# Altium integrated library Blues Wireless Library.IntLib: 99 symbols (part 1 of 2)
Pins are listed as number, name and electrical type; pins without a type are passive.

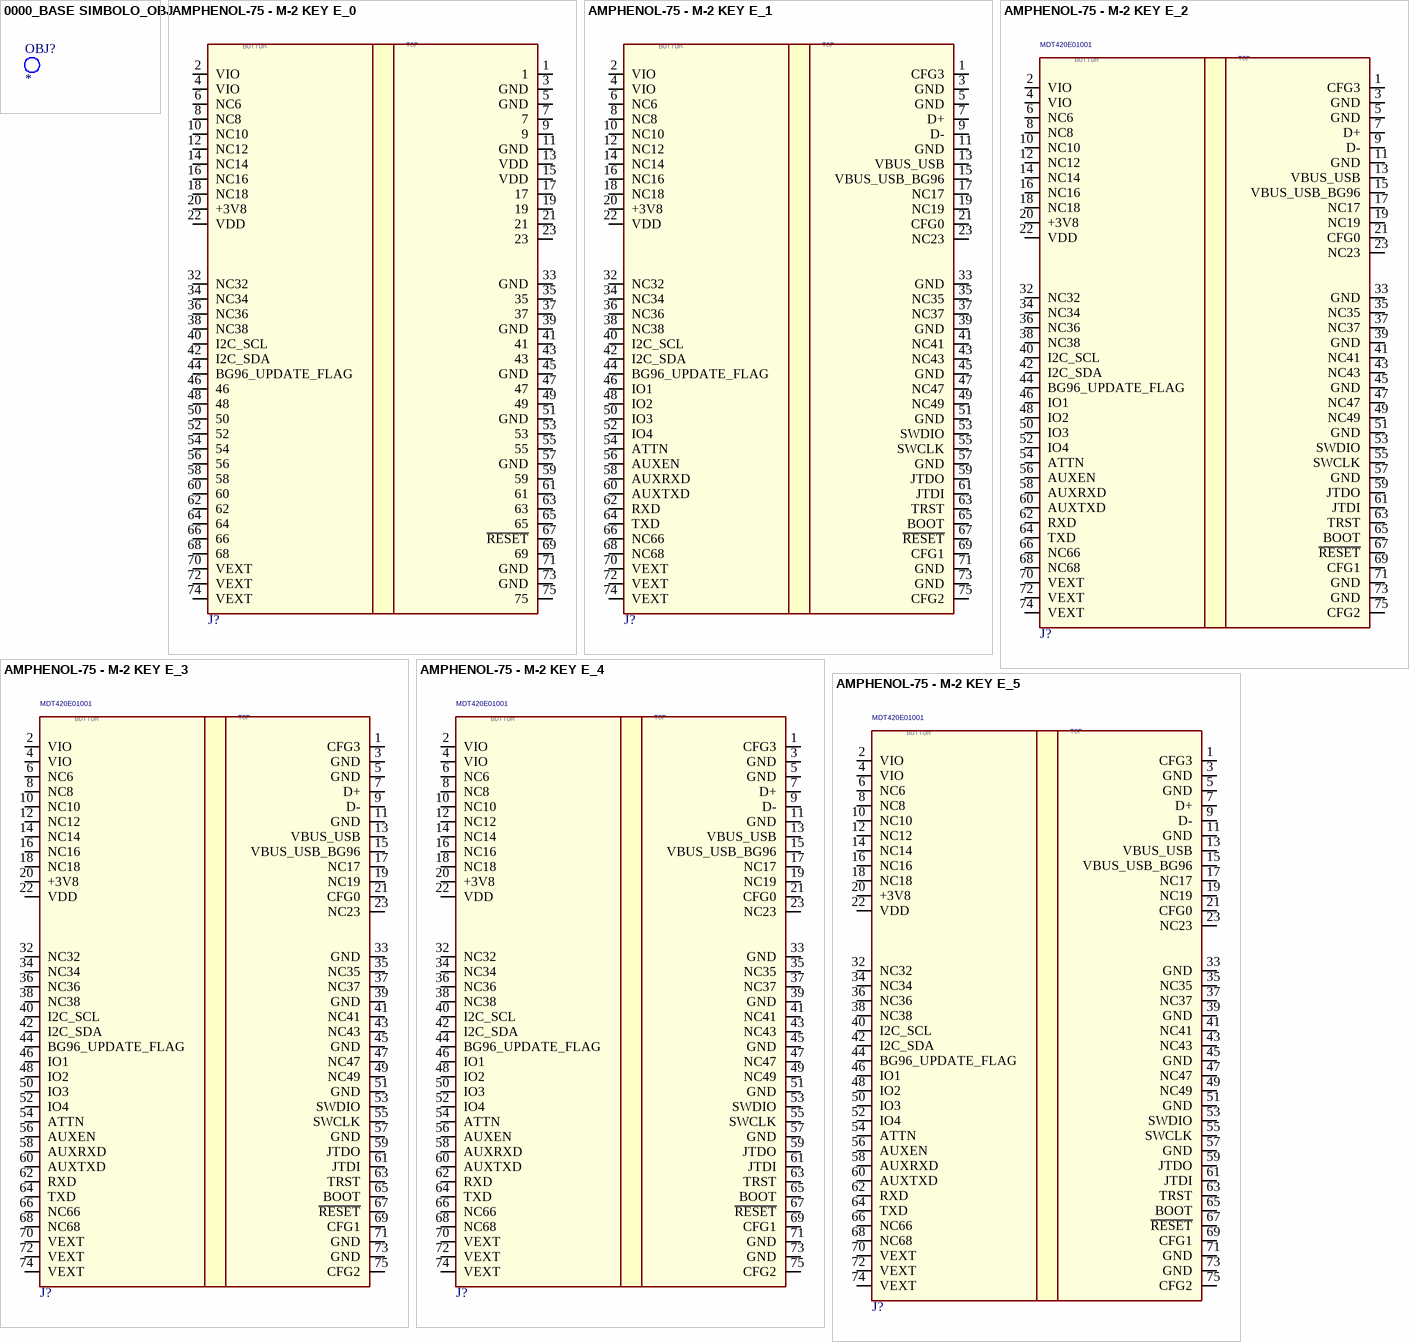
[diagram p0: symbols 0000_BASE SIMBOLO_OBJ to AMPHENOL-75 - M-2 KEY E_5]

## 0000_BASE SIMBOLO_OBJ
designator OBJ?

## AMPHENOL-75 - M-2 KEY E_0
designator J?, comment MDT420E01001  (value not drawn)
CONN. 75P P=0.5 MDT420E01001 AMPHENOL SMT; Famiglia: CONNETTORE; Pkg Type: SMD; Temp Range: -40°..+80°; Caratteristiche: 75P; Distributor: D-MDT420E01001CT-ND; Price Distributor Cad: 1,21
footprint M2-E-AMPHENOL-75
pins: 1, 2 VIO (power), 3 GND (power), 4 VIO (power), 5 GND (power), 6 NC6, 7, 8 NC8, 9, 10 NC10, 11 GND (power), 12 NC12, 13 VDD (power), 14 NC14, 15 VDD (power), 16 NC16, 17, 18 NC18, 19, 20 +3V8 (power), 21, 22 VDD (power), 23, 32 NC32, 33 GND (power), 34 NC34, 35, 36 NC36, 37, 38 NC38, 39 GND (power), 40 I2C_SCL, 41, 42 I2C_SDA, 43, 44 BG96_UPDATE_FLAG, 45 GND (power), 46, 47, 48, 49, 50, 51 GND (power), 52, 53, 54, 55, 56, 57 GND (power), 58, 59, 60, 61, 62, 63, 64, 65, 66, 67 ~{RESET}, 68, 69, 70 VEXT (power), 71 GND (power), 72 VEXT (power), 73 GND (power), 74 VEXT (power), 75
text: BOTTOM; TOP

## AMPHENOL-75 - M-2 KEY E_1
designator J?, comment MDT420E01001  (value not drawn)
CONN. 75P P=0.5 MDT420E01001 AMPHENOL SMT; Famiglia: CONNETTORE; Pkg Type: SMD; Temp Range: -40°..+80°; Caratteristiche: 75P; Distributor: D-MDT420E01001CT-ND; Price Distributor Cad: 1,21
footprint M2-E-AMPHENOL-75
pins: 1 CFG3, 2 VIO (power), 3 GND (power), 4 VIO (power), 5 GND (power), 6 NC6, 7 D+, 8 NC8, 9 D-, 10 NC10, 11 GND (power), 12 NC12, 13 VBUS_USB (power), 14 NC14, 15 VBUS_USB_BG96 (power), 16 NC16, 17 NC17, 18 NC18, 19 NC19, 20 +3V8 (power), 21 CFG0, 22 VDD (power), 23 NC23, 32 NC32, 33 GND (power), 34 NC34, 35 NC35, 36 NC36, 37 NC37, 38 NC38, 39 GND (power), 40 I2C_SCL, 41 NC41, 42 I2C_SDA, 43 NC43, 44 BG96_UPDATE_FLAG, 45 GND (power), 46 IO1, 47 NC47, 48 IO2, 49 NC49, 50 IO3, 51 GND (power), 52 IO4, 53 SWDIO, 54 ATTN, 55 SWCLK, 56 AUXEN, 57 GND (power), 58 AUXRXD, 59 JTDO, 60 AUXTXD, 61 JTDI, 62 RXD, 63 TRST, 64 TXD, 65 BOOT, 66 NC66, 67 ~{RESET}, 68 NC68, 69 CFG1, 70 VEXT (power), 71 GND (power), 72 VEXT (power), 73 GND (power), 74 VEXT (power), 75 CFG2
text: BOTTOM; TOP

## AMPHENOL-75 - M-2 KEY E_2
designator J?, comment MDT420E01001
CONN. 75P P=0.5 MDT420E01001 AMPHENOL SMT; Famiglia: CONNETTORE; Pkg Type: SMD; Temp Range: -40°..+80°; Caratteristiche: 75P; Distributor: D-MDT420E01001CT-ND; Price Distributor Cad: 1,21
footprint M2-E-AMPHENOL-75
pins: 1 CFG3, 2 VIO (power), 3 GND (power), 4 VIO (power), 5 GND (power), 6 NC6, 7 D+, 8 NC8, 9 D-, 10 NC10, 11 GND (power), 12 NC12, 13 VBUS_USB (power), 14 NC14, 15 VBUS_USB_BG96 (power), 16 NC16, 17 NC17, 18 NC18, 19 NC19, 20 +3V8 (power), 21 CFG0, 22 VDD (power), 23 NC23, 32 NC32, 33 GND (power), 34 NC34, 35 NC35, 36 NC36, 37 NC37, 38 NC38, 39 GND (power), 40 I2C_SCL, 41 NC41, 42 I2C_SDA, 43 NC43, 44 BG96_UPDATE_FLAG, 45 GND (power), 46 IO1, 47 NC47, 48 IO2, 49 NC49, 50 IO3, 51 GND (power), 52 IO4, 53 SWDIO, 54 ATTN, 55 SWCLK, 56 AUXEN, 57 GND (power), 58 AUXRXD, 59 JTDO, 60 AUXTXD, 61 JTDI, 62 RXD, 63 TRST, 64 TXD, 65 BOOT, 66 NC66, 67 ~{RESET}, 68 NC68, 69 CFG1, 70 VEXT (power), 71 GND (power), 72 VEXT (power), 73 GND (power), 74 VEXT (power), 75 CFG2
text: BOTTOM; TOP

## AMPHENOL-75 - M-2 KEY E_3
designator J?, comment MDT420E01001
CONN. 75P P=0.5 MDT420E01001 AMPHENOL SMT; Temp Range: -40°..+80°; Pkg Type: SMD; Famiglia: CONNETTORE; Price Distributor Cad: 1,21; Distributor: D-MDT420E01001CT-ND; Caratteristiche: 75P
footprint J-75-0050-MOS-M2
pins: 1 CFG3, 2 VIO (power), 3 GND (power), 4 VIO (power), 5 GND (power), 6 NC6, 7 D+, 8 NC8, 9 D-, 10 NC10, 11 GND (power), 12 NC12, 13 VBUS_USB (power), 14 NC14, 15 VBUS_USB_BG96 (power), 16 NC16, 17 NC17, 18 NC18, 19 NC19, 20 +3V8 (power), 21 CFG0, 22 VDD (power), 23 NC23, 32 NC32, 33 GND (power), 34 NC34, 35 NC35, 36 NC36, 37 NC37, 38 NC38, 39 GND (power), 40 I2C_SCL, 41 NC41, 42 I2C_SDA, 43 NC43, 44 BG96_UPDATE_FLAG, 45 GND (power), 46 IO1, 47 NC47, 48 IO2, 49 NC49, 50 IO3, 51 GND (power), 52 IO4, 53 SWDIO, 54 ATTN, 55 SWCLK, 56 AUXEN, 57 GND (power), 58 AUXRXD, 59 JTDO, 60 AUXTXD, 61 JTDI, 62 RXD, 63 TRST, 64 TXD, 65 BOOT, 66 NC66, 67 ~{RESET}, 68 NC68, 69 CFG1, 70 VEXT (power), 71 GND (power), 72 VEXT (power), 73 GND (power), 74 VEXT (power), 75 CFG2
text: BOTTOM; TOP

## AMPHENOL-75 - M-2 KEY E_4
designator J?, comment MDT420E01001
CONN. 75P P=0.5 MDT420E01001 AMPHENOL SMT; Temp Range: -40°..+80°; Pkg Type: SMD; Famiglia: CONNETTORE; Price Distributor Cad: 1,21; Distributor: D-MDT420E01001CT-ND; Caratteristiche: 75P
footprint J-75-0050-MOS-M2
pins: 1 CFG3, 2 VIO (power), 3 GND (power), 4 VIO (power), 5 GND (power), 6 NC6, 7 D+, 8 NC8, 9 D-, 10 NC10, 11 GND (power), 12 NC12, 13 VBUS_USB (power), 14 NC14, 15 VBUS_USB_BG96 (power), 16 NC16, 17 NC17, 18 NC18, 19 NC19, 20 +3V8 (power), 21 CFG0, 22 VDD (power), 23 NC23, 32 NC32, 33 GND (power), 34 NC34, 35 NC35, 36 NC36, 37 NC37, 38 NC38, 39 GND (power), 40 I2C_SCL, 41 NC41, 42 I2C_SDA, 43 NC43, 44 BG96_UPDATE_FLAG, 45 GND (power), 46 IO1, 47 NC47, 48 IO2, 49 NC49, 50 IO3, 51 GND (power), 52 IO4, 53 SWDIO, 54 ATTN, 55 SWCLK, 56 AUXEN, 57 GND (power), 58 AUXRXD, 59 JTDO, 60 AUXTXD, 61 JTDI, 62 RXD, 63 TRST, 64 TXD, 65 BOOT, 66 NC66, 67 ~{RESET}, 68 NC68, 69 CFG1, 70 VEXT (power), 71 GND (power), 72 VEXT (power), 73 GND (power), 74 VEXT (power), 75 CFG2
text: BOTTOM; TOP

## AMPHENOL-75 - M-2 KEY E_5
designator J?, comment MDT420E01001
CONN. 75P P=0.5 MDT420E01001 AMPHENOL SMT; Famiglia: CONNETTORE; Pkg Type: SMD; Temp Range: -40°..+80°; Caratteristiche: 75P; Distributor: D-MDT420E01001CT-ND; Price Distributor Cad: 1,21
footprint J-75-0050-MOS-M2
pins: 1 CFG3, 2 VIO (power), 3 GND (power), 4 VIO (power), 5 GND (power), 6 NC6, 7 D+, 8 NC8, 9 D-, 10 NC10, 11 GND (power), 12 NC12, 13 VBUS_USB (power), 14 NC14, 15 VBUS_USB_BG96 (power), 16 NC16, 17 NC17, 18 NC18, 19 NC19, 20 +3V8 (power), 21 CFG0, 22 VDD (power), 23 NC23, 32 NC32, 33 GND (power), 34 NC34, 35 NC35, 36 NC36, 37 NC37, 38 NC38, 39 GND (power), 40 I2C_SCL, 41 NC41, 42 I2C_SDA, 43 NC43, 44 BG96_UPDATE_FLAG, 45 GND (power), 46 IO1, 47 NC47, 48 IO2, 49 NC49, 50 IO3, 51 GND (power), 52 IO4, 53 SWDIO, 54 ATTN, 55 SWCLK, 56 AUXEN, 57 GND (power), 58 AUXRXD, 59 JTDO, 60 AUXTXD, 61 JTDI, 62 RXD, 63 TRST, 64 TXD, 65 BOOT, 66 NC66, 67 ~{RESET}, 68 NC68, 69 CFG1, 70 VEXT (power), 71 GND (power), 72 VEXT (power), 73 GND (power), 74 VEXT (power), 75 CFG2
text: BOTTOM; TOP

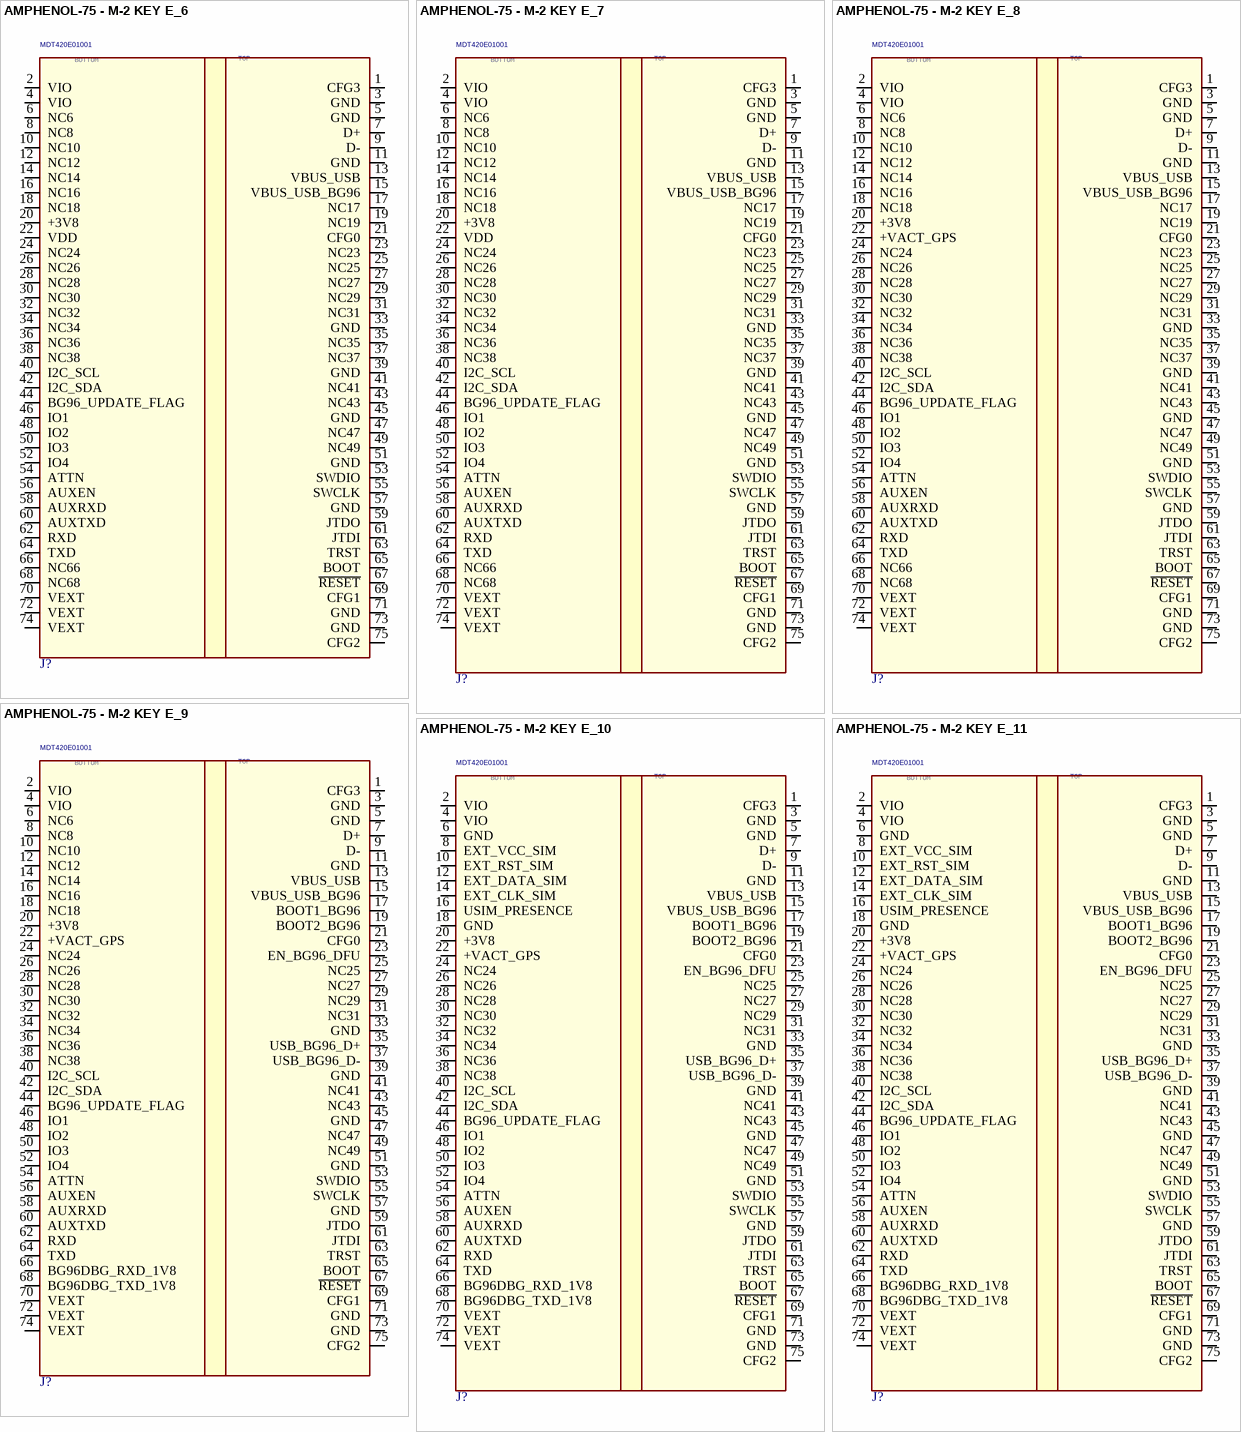
[diagram p1: symbols AMPHENOL-75 - M-2 KEY E_6 to AMPHENOL-75 - M-2 KEY E_11]

## AMPHENOL-75 - M-2 KEY E_6
designator J?, comment MDT420E01001
CONN. 75P P=0.5 MDT420E01001 AMPHENOL SMT; Temp Range: -40°..+80°; Pkg Type: SMD; Famiglia: CONNETTORE; Price Distributor Cad: 1,21; Distributor: D-MDT420E01001CT-ND; Caratteristiche: 75P
footprint J-75-0050-MOS-M2
pins: 1 CFG3, 2 VIO (power), 3 GND (power), 4 VIO (power), 5 GND (power), 6 NC6, 7 D+, 8 NC8, 9 D-, 10 NC10, 11 GND (power), 12 NC12, 13 VBUS_USB (power), 14 NC14, 15 VBUS_USB_BG96 (power), 16 NC16, 17 NC17, 18 NC18, 19 NC19, 20 +3V8 (power), 21 CFG0, 22 VDD (power), 23 NC23, 24 NC24, 25 NC25, 26 NC26, 27 NC27, 28 NC28, 29 NC29, 30 NC30, 31 NC31, 32 NC32, 33 GND (power), 34 NC34, 35 NC35, 36 NC36, 37 NC37, 38 NC38, 39 GND (power), 40 I2C_SCL, 41 NC41, 42 I2C_SDA, 43 NC43, 44 BG96_UPDATE_FLAG, 45 GND (power), 46 IO1, 47 NC47, 48 IO2, 49 NC49, 50 IO3, 51 GND (power), 52 IO4, 53 SWDIO, 54 ATTN, 55 SWCLK, 56 AUXEN, 57 GND (power), 58 AUXRXD, 59 JTDO, 60 AUXTXD, 61 JTDI, 62 RXD, 63 TRST, 64 TXD, 65 BOOT, 66 NC66, 67 ~{RESET}, 68 NC68, 69 CFG1, 70 VEXT (power), 71 GND (power), 72 VEXT (power), 73 GND (power), 74 VEXT (power), 75 CFG2
text: BOTTOM; TOP

## AMPHENOL-75 - M-2 KEY E_7
designator J?, comment MDT420E01001
CONN. 75P P=0.5 MDT420E01001 AMPHENOL SMT; Temp Range: -40°..+80°; Pkg Type: SMD; Famiglia: CONNETTORE; Price Distributor Cad: 1,21; Distributor: D-MDT420E01001CT-ND; Caratteristiche: 75P
footprint J-75-0050-MOS-M2
pins: 1 CFG3, 2 VIO (power), 3 GND (power), 4 VIO (power), 5 GND (power), 6 NC6, 7 D+, 8 NC8, 9 D-, 10 NC10, 11 GND (power), 12 NC12, 13 VBUS_USB (power), 14 NC14, 15 VBUS_USB_BG96 (power), 16 NC16, 17 NC17, 18 NC18, 19 NC19, 20 +3V8 (power), 21 CFG0, 22 VDD (power), 23 NC23, 24 NC24, 25 NC25, 26 NC26, 27 NC27, 28 NC28, 29 NC29, 30 NC30, 31 NC31, 32 NC32, 33 GND (power), 34 NC34, 35 NC35, 36 NC36, 37 NC37, 38 NC38, 39 GND (power), 40 I2C_SCL, 41 NC41, 42 I2C_SDA, 43 NC43, 44 BG96_UPDATE_FLAG, 45 GND (power), 46 IO1, 47 NC47, 48 IO2, 49 NC49, 50 IO3, 51 GND (power), 52 IO4, 53 SWDIO, 54 ATTN, 55 SWCLK, 56 AUXEN, 57 GND (power), 58 AUXRXD, 59 JTDO, 60 AUXTXD, 61 JTDI, 62 RXD, 63 TRST, 64 TXD, 65 BOOT, 66 NC66, 67 ~{RESET}, 68 NC68, 69 CFG1, 70 VEXT (power), 71 GND (power), 72 VEXT (power), 73 GND (power), 74 VEXT (power), 75 CFG2
text: BOTTOM; TOP

## AMPHENOL-75 - M-2 KEY E_8
designator J?, comment MDT420E01001
CONN. 75P P=0.5 MDT420E01001 AMPHENOL SMT; Famiglia: CONNETTORE; Pkg Type: SMD; Temp Range: -40°..+80°; Caratteristiche: 75P; Distributor: D-MDT420E01001CT-ND; Price Distributor Cad: 1,21
footprint J-75-0050-MOS-M2
pins: 1 CFG3, 2 VIO (power), 3 GND (power), 4 VIO (power), 5 GND (power), 6 NC6, 7 D+, 8 NC8, 9 D-, 10 NC10, 11 GND (power), 12 NC12, 13 VBUS_USB (power), 14 NC14, 15 VBUS_USB_BG96 (power), 16 NC16, 17 NC17, 18 NC18, 19 NC19, 20 +3V8 (power), 21 CFG0, 22 +VACT_GPS, 23 NC23, 24 NC24, 25 NC25, 26 NC26, 27 NC27, 28 NC28, 29 NC29, 30 NC30, 31 NC31, 32 NC32, 33 GND (power), 34 NC34, 35 NC35, 36 NC36, 37 NC37, 38 NC38, 39 GND (power), 40 I2C_SCL, 41 NC41, 42 I2C_SDA, 43 NC43, 44 BG96_UPDATE_FLAG, 45 GND (power), 46 IO1, 47 NC47, 48 IO2, 49 NC49, 50 IO3, 51 GND (power), 52 IO4, 53 SWDIO, 54 ATTN, 55 SWCLK, 56 AUXEN, 57 GND (power), 58 AUXRXD, 59 JTDO, 60 AUXTXD, 61 JTDI, 62 RXD, 63 TRST, 64 TXD, 65 BOOT, 66 NC66, 67 ~{RESET}, 68 NC68, 69 CFG1, 70 VEXT (power), 71 GND (power), 72 VEXT (power), 73 GND (power), 74 VEXT (power), 75 CFG2
text: BOTTOM; TOP

## AMPHENOL-75 - M-2 KEY E_9
designator J?, comment MDT420E01001
CONN. 75P P=0.5 MDT420E01001 AMPHENOL SMT; Famiglia: CONNETTORE; Pkg Type: SMD; Temp Range: -40°..+80°; Caratteristiche: 75P; Distributor: D-MDT420E01001CT-ND; Price Distributor Cad: 1,21
footprint J-75-0050-MOS-M2
pins: 1 CFG3, 2 VIO (power), 3 GND (power), 4 VIO (power), 5 GND (power), 6 NC6, 7 D+, 8 NC8, 9 D-, 10 NC10, 11 GND (power), 12 NC12, 13 VBUS_USB (power), 14 NC14, 15 VBUS_USB_BG96 (power), 16 NC16, 17 BOOT1_BG96, 18 NC18, 19 BOOT2_BG96, 20 +3V8 (power), 21 CFG0, 22 +VACT_GPS, 23 EN_BG96_DFU, 24 NC24, 25 NC25, 26 NC26, 27 NC27, 28 NC28, 29 NC29, 30 NC30, 31 NC31, 32 NC32, 33 GND (power), 34 NC34, 35 USB_BG96_D+, 36 NC36, 37 USB_BG96_D-, 38 NC38, 39 GND (power), 40 I2C_SCL, 41 NC41, 42 I2C_SDA, 43 NC43, 44 BG96_UPDATE_FLAG, 45 GND (power), 46 IO1, 47 NC47, 48 IO2, 49 NC49, 50 IO3, 51 GND (power), 52 IO4, 53 SWDIO, 54 ATTN, 55 SWCLK, 56 AUXEN, 57 GND (power), 58 AUXRXD, 59 JTDO, 60 AUXTXD, 61 JTDI, 62 RXD, 63 TRST, 64 TXD, 65 BOOT, 66 BG96DBG_RXD_1V8, 67 ~{RESET}, 68 BG96DBG_TXD_1V8, 69 CFG1, 70 VEXT (power), 71 GND (power), 72 VEXT (power), 73 GND (power), 74 VEXT (power), 75 CFG2
text: BOTTOM; TOP

## AMPHENOL-75 - M-2 KEY E_10
designator J?, comment MDT420E01001
CONN. 75P P=0.5 MDT420E01001 AMPHENOL SMT; Famiglia: CONNETTORE; Pkg Type: SMD; Temp Range: -40°..+80°; Caratteristiche: 75P; Distributor: D-MDT420E01001CT-ND; Price Distributor Cad: 1,21
footprint J-75-0050-MOS-M2
pins: 1 CFG3, 2 VIO (power), 3 GND (power), 4 VIO (power), 5 GND (power), 6 GND (power), 7 D+, 8 EXT_VCC_SIM, 9 D-, 10 EXT_RST_SIM, 11 GND (power), 12 EXT_DATA_SIM, 13 VBUS_USB (power), 14 EXT_CLK_SIM, 15 VBUS_USB_BG96 (power), 16 USIM_PRESENCE, 17 BOOT1_BG96, 18 GND (power), 19 BOOT2_BG96, 20 +3V8 (power), 21 CFG0, 22 +VACT_GPS, 23 EN_BG96_DFU, 24 NC24, 25 NC25, 26 NC26, 27 NC27, 28 NC28, 29 NC29, 30 NC30, 31 NC31, 32 NC32, 33 GND (power), 34 NC34, 35 USB_BG96_D+, 36 NC36, 37 USB_BG96_D-, 38 NC38, 39 GND (power), 40 I2C_SCL, 41 NC41, 42 I2C_SDA, 43 NC43, 44 BG96_UPDATE_FLAG, 45 GND (power), 46 IO1, 47 NC47, 48 IO2, 49 NC49, 50 IO3, 51 GND (power), 52 IO4, 53 SWDIO, 54 ATTN, 55 SWCLK, 56 AUXEN, 57 GND (power), 58 AUXRXD, 59 JTDO, 60 AUXTXD, 61 JTDI, 62 RXD, 63 TRST, 64 TXD, 65 BOOT, 66 BG96DBG_RXD_1V8, 67 ~{RESET}, 68 BG96DBG_TXD_1V8, 69 CFG1, 70 VEXT (power), 71 GND (power), 72 VEXT (power), 73 GND (power), 74 VEXT (power), 75 CFG2
text: BOTTOM; TOP

## AMPHENOL-75 - M-2 KEY E_11
designator J?, comment MDT420E01001
CONN. 75P P=0.5 MDT420E01001 AMPHENOL SMT; Famiglia: CONNETTORE; Pkg Type: SMD; Temp Range: -40°..+80°; Caratteristiche: 75P; Distributor: D-MDT420E01001CT-ND; Price Distributor Cad: 1,21
footprint J-75-0050-MOS-M2
pins: 1 CFG3, 2 VIO (power), 3 GND (power), 4 VIO (power), 5 GND (power), 6 GND (power), 7 D+, 8 EXT_VCC_SIM, 9 D-, 10 EXT_RST_SIM, 11 GND (power), 12 EXT_DATA_SIM, 13 VBUS_USB (power), 14 EXT_CLK_SIM, 15 VBUS_USB_BG96, 16 USIM_PRESENCE, 17 BOOT1_BG96, 18 GND (power), 19 BOOT2_BG96, 20 +3V8 (power), 21 CFG0, 22 +VACT_GPS, 23 EN_BG96_DFU, 24 NC24, 25 NC25, 26 NC26, 27 NC27, 28 NC28, 29 NC29, 30 NC30, 31 NC31, 32 NC32, 33 GND (power), 34 NC34, 35 USB_BG96_D+, 36 NC36, 37 USB_BG96_D-, 38 NC38, 39 GND (power), 40 I2C_SCL, 41 NC41, 42 I2C_SDA, 43 NC43, 44 BG96_UPDATE_FLAG, 45 GND (power), 46 IO1, 47 NC47, 48 IO2, 49 NC49, 50 IO3, 51 GND (power), 52 IO4, 53 SWDIO, 54 ATTN, 55 SWCLK, 56 AUXEN, 57 GND (power), 58 AUXRXD, 59 JTDO, 60 AUXTXD, 61 JTDI, 62 RXD, 63 TRST, 64 TXD, 65 BOOT, 66 BG96DBG_RXD_1V8, 67 ~{RESET}, 68 BG96DBG_TXD_1V8, 69 CFG1, 70 VEXT (power), 71 GND (power), 72 VEXT (power), 73 GND (power), 74 VEXT (power), 75 CFG2
text: BOTTOM; TOP

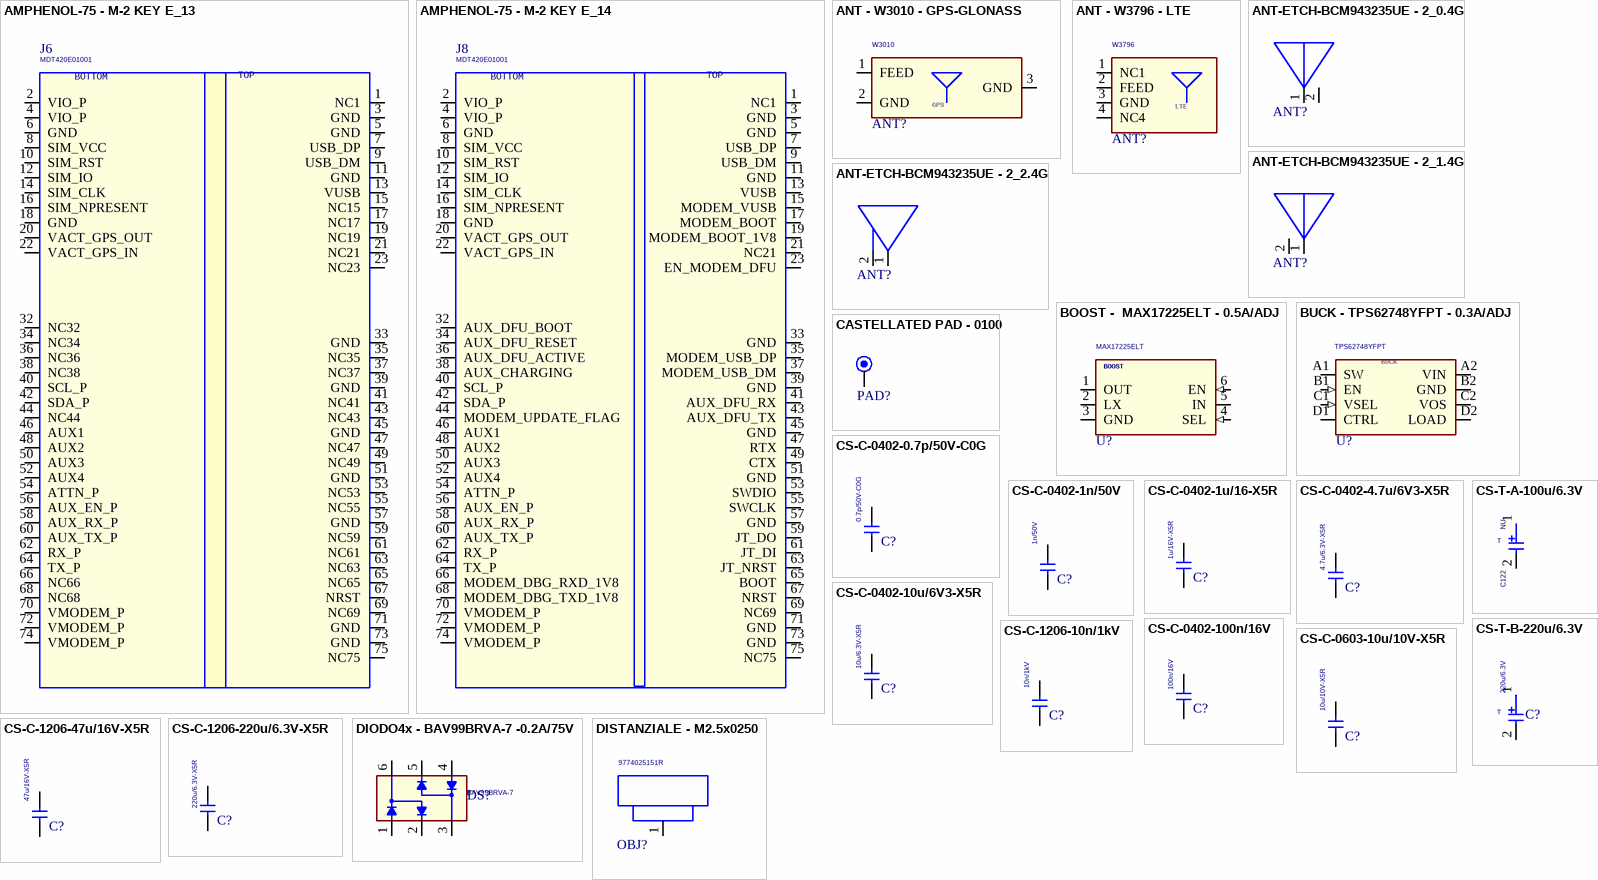
[diagram p2: symbols AMPHENOL-75 - M-2 KEY E_13 to DISTANZIALE - M2.5x0250]

## AMPHENOL-75 - M-2 KEY E_13
designator J6, comment MDT420E01001
CONN. M.2 75P M/90° P=0.5 MDT420E01001 AMPHENOL SMT; Famiglia: CONNETTORE; Pkg Type: SMD; Temp Range: -40°..+80°; ROOM: M2 CONNECTOR; PCB Footprint: J-75-0050-MOS-M2-E; Caratteristiche: 75P; Distributor: D-MDT420E01001CT-ND; Price Distributor Cad: 1,21
footprint J-75-0050-MOS-M2-E
footprint J-75-0050-MOS-M2-E
pins: 1 NC1, 2 VIO_P (power), 3 GND (power), 4 VIO_P (power), 5 GND (power), 6 GND (power), 7 USB_DP, 8 SIM_VCC, 9 USB_DM, 10 SIM_RST, 11 GND (power), 12 SIM_IO, 13 VUSB (power), 14 SIM_CLK, 15 NC15, 16 SIM_NPRESENT, 17 NC17, 18 GND (power), 19 NC19, 20 VACT_GPS_OUT (power), 21 NC21, 22 VACT_GPS_IN, 23 NC23, 32 NC32, 33 GND (power), 34 NC34, 35 NC35, 36 NC36, 37 NC37, 38 NC38, 39 GND (power), 40 SCL_P, 41 NC41, 42 SDA_P, 43 NC43, 44 NC44, 45 GND (power), 46 AUX1, 47 NC47, 48 AUX2, 49 NC49, 50 AUX3, 51 GND (power), 52 AUX4, 53 NC53, 54 ATTN_P, 55 NC55, 56 AUX_EN_P, 57 GND (power), 58 AUX_RX_P, 59 NC59, 60 AUX_TX_P, 61 NC61, 62 RX_P, 63 NC63, 64 TX_P, 65 NC65, 66 NC66, 67 NRST, 68 NC68, 69 NC69, 70 VMODEM_P (power), 71 GND (power), 72 VMODEM_P (power), 73 GND (power), 74 VMODEM_P (power), 75 NC75
text: BOTTOM; TOP

## AMPHENOL-75 - M-2 KEY E_14
designator J8, comment MDT420E01001
CONN. M.2 75P M/90° P=0.5 MDT420E01001 AMPHENOL SMT; Temp Range: -40°..+80°; Pkg Type: SMD; Famiglia: CONNETTORE; Database: 44633; PCB Footprint: J-75-0050-MOS-M2-E; Price Distributor Cad: 1,079; Distributor: FAE; Caratteristiche: 75P
footprint J-75-0050-MOS-M2
footprint J-75-0050-MOS-M2-E
pins: 1 NC1, 2 VIO_P (power), 3 GND (power), 4 VIO_P (power), 5 GND (power), 6 GND (power), 7 USB_DP, 8 SIM_VCC, 9 USB_DM, 10 SIM_RST, 11 GND (power), 12 SIM_IO, 13 VUSB (power), 14 SIM_CLK, 15 MODEM_VUSB (power), 16 SIM_NPRESENT, 17 MODEM_BOOT, 18 GND (power), 19 MODEM_BOOT_1V8, 20 VACT_GPS_OUT (power), 21 NC21, 22 VACT_GPS_IN, 23 EN_MODEM_DFU, 32 AUX_DFU_BOOT, 33 GND (power), 34 AUX_DFU_RESET, 35 MODEM_USB_DP, 36 AUX_DFU_ACTIVE, 37 MODEM_USB_DM, 38 AUX_CHARGING, 39 GND (power), 40 SCL_P, 41 AUX_DFU_RX, 42 SDA_P, 43 AUX_DFU_TX, 44 MODEM_UPDATE_FLAG, 45 GND (power), 46 AUX1, 47 RTX, 48 AUX2, 49 CTX, 50 AUX3, 51 GND (power), 52 AUX4, 53 SWDIO, 54 ATTN_P, 55 SWCLK, 56 AUX_EN_P, 57 GND (power), 58 AUX_RX_P, 59 JT_DO, 60 AUX_TX_P, 61 JT_DI, 62 RX_P, 63 JT_NRST, 64 TX_P, 65 BOOT, 66 MODEM_DBG_RXD_1V8, 67 NRST, 68 MODEM_DBG_TXD_1V8, 69 NC69, 70 VMODEM_P (power), 71 GND (power), 72 VMODEM_P (power), 73 GND (power), 74 VMODEM_P (power), 75 NC75
text: BOTTOM; TOP

## ANT - W3010 - GPS-GLONASS
designator ANT?, comment W3010
ANTENNA CHIP 1.575GHZ D=3.2X10X2 W3010 PULSE SMT; Caratteristiche: 1.575GHz - GPS/GLONASS; Database: 43082; Famiglia: INDUTTORE; Modello: ANTENNA GPS; Pkg Type: SMD; Temp Range: -40°..+85°; Distributor: FAE; Price Distributor Cad: 1,21
footprint ANT-W3010
pins: 1 FEED, 2 GND (power), 3 GND (power)
text: GPS

## ANT - W3796 - LTE
designator ANT?, comment W3796
ANTENNA CHIP LTE D=40X7X3 W3796 PULSE SMT; Database: 43080; Famiglia: INDUTTORE; Modello: ANTENNA LTE; Note: 698MHz-960MHz - 1.427GHz-1.66GHz - 1.695GHz-2.2GHz - 2.3GHz-2.7GHz; Pkg Type: SMD; Temp Range: -40°..+85°; Caratteristiche: LTE; Distributor: FAE; Price Distributor Cad: 3,85
footprint ANT-W3796
pins: 1 NC1, 2 FEED, 3 GND (power), 4 NC4

## ANT-ETCH-BCM943235UE - 2_0.4G
designator ANT?, comment TPS  (value not drawn)
ANTENNA WIFI-BLE 2.4GHZ; Pkg Type: SMD; Famiglia: INDUTTORE; Caratteristiche: WIFI-BLE-2.4GHz; Distributor: FAE; Modello: ANTENNA
footprint ANT-ETCH-BCM943235UE
pins: 1, 2

## ANT-ETCH-BCM943235UE - 2_1.4G
designator ANT?, comment TPS  (value not drawn)
ANTENNA WIFI-BLE 2.4GHZ; Pkg Type: SMD; Famiglia: INDUTTORE; Caratteristiche: WIFI-BLE-2.4GHz; Distributor: FAE; Modello: ANTENNA
footprint ANT-ETCH-BCM943235UE
pins: 1, 2

## ANT-ETCH-BCM943235UE - 2_2.4G
designator ANT?, comment TPS  (value not drawn)
ANTENNA WIFI-BLE 2.4GHZ; Pkg Type: SMD; Famiglia: INDUTTORE; Caratteristiche: WIFI-BLE-2.4GHz; Distributor: FAE; Modello: ANTENNA
footprint ANT-ETCH-BCM943235UE
pins: 1, 2

## BOOST -  MAX17225ELT - 0.5A/ADJ
designator U?, comment MAX17225ELT
INTEGRATO MAX17225ELT+T MAXIM W-DFN6 SMT; Note: 2MHz; Pkg Type: SMD; Temp Range: -40°..+85°; Database: 42404; Modello: BOOST; Caratteristiche: 500mA/ADJ; Distributor: FAE; Price Distributor Cad: 1,52; Famiglia: INTEGRATO
footprint WDFN6-0200X0200
pins: 1 OUT (power), 2 LX, 3 GND (power), 4 SEL (in), 5 IN (power), 6 EN (in)

## BUCK - TPS62748YFPT - 0.3A/ADJ
designator U?, comment TPS62748YFPT
INTEGRATO TPS62748YFPT TEXAS DSBGA8 SMT; Caratteristiche: 300mA/ADJ; Database: 42813; Modello: BUCK; Pkg Type: SMD; Temp Range: -40°..+85°; Distributor: FAE; Famiglia: INTEGRATO; Price Distributor Cad: 1,4427
footprint XFBGA8
pins: A1 SW, A2 VIN (power), B1 EN (in), B2 GND (power), C1 VSEL (in), C2 VOS, D1 CTRL, D2 LOAD

## CASTELLATED PAD - 0100
designator PAD?, comment TPS  (value not drawn)
CASTELLATED EDGE VIAS; Pkg Type: THT; Distributor: FAE
footprint PAD-THT-CAS-0100
pins: 1

## CS-C-0402-0.7p/50V-C0G
designator C?, comment 0.7p/50V-C0G
CHIP CAP.CER. 0.7pF 50V ±0.1 C0G 0402 GJM1555C1HR70BB01D MURATA; Database: 43076; Famiglia: CONDENSATORE; Modello: CERAMICO; Note: RF; Pkg Type: SMD; Temp Range: -55°..+125°; Caratteristiche: C0G; Distributor: FAE; Price Distributor Cad: 0,111
footprint CS-C-0402
pins: 1, 2

## CS-C-0402-1n/50V
designator C?, comment 1n/50V
CHIP CAP.CER. 1nF 50V 10% X7R 0402; Famiglia: CONDENSATORE; Modello: CERAMICO; Database: 33357; Pkg Type: SMD; Caratteristiche: X7R; Distributor: FAE; Price Distributor Cad: 0,0007
footprint CS-C-0402
pins: 1, 2

## CS-C-0402-1u/16-X5R
designator C?, comment 1u/16V-X5R
CHIP CAP.CER. 1uF 16V 10% X5R 0402; Famiglia: CONDENSATORE; Modello: CERAMICO; Pkg Type: SMD; Database: 37485; Caratteristiche: X5R; Price Distributor Cad: 0,0016; Distributor: FAE
footprint CS-C-0402
pins: 1, 2

## CS-C-0402-4.7u/6V3-X5R
designator C?, comment 4.7u/6.3V-X5R
CHIP CAP.CER. 4.7uF 6.3V 20% X5R 0402; Famiglia: CONDENSATORE; Modello: CERAMICO; Pkg Type: SMD; Database: 32468; Caratteristiche: X5R; Price Distributor Cad: 0,0052; Distributor: FAE
footprint CS-C-0402
pins: 1, 2

## CS-C-0402-10u/6V3-X5R
designator C?, comment 10u/6.3V-X5R
CHIP CAP.CER. 10uF 6.3V 20% X5R 0402; Famiglia: CONDENSATORE; Modello: CERAMICO; Pkg Type: SMD; Temp Range: -55°..+85°; Database: 39310; Caratteristiche: X5R; Price Distributor Cad: 0,0141; Distributor: FAE
footprint CS-C-0402
pins: 1, 2

## CS-C-0402-100n/16V
designator C?, comment 100n/16V
CHIP CAP.CER. 100nF 16V 10% X7R 0402; Famiglia: CONDENSATORE; Modello: CERAMICO; Database: 22452; Pkg Type: SMD; Caratteristiche: X7R; Distributor: FAE; Price Distributor Cad: 0,001
footprint CS-C-0402
pins: 1, 2

## CS-C-0603-10u/10V-X5R
designator C?, comment 10u/10V-X5R
CHIP CAP.CER. 10uF 10V 10% X5R 0603; Pkg Type: SMD; Database: 28168; Modello: CERAMICO; Famiglia: CONDENSATORE; Price Distributor Cad: 0,0151; Distributor: FAE; Caratteristiche: X5R
footprint CS-C-0603
pins: 1, 2

## CS-C-1206-10n/1kV
designator C?, comment 10n/1kV
CHIP CAP.CER. 10nF 1000V 10% X7R 1206; Famiglia: CONDENSATORE; Modello: CERAMICO; Pkg Type: SMD; Database: 28470; Caratteristiche: X7R; Price Distributor Cad: 0,035; Distributor: FAE
footprint CS-C-1206
pins: 1, 2

## CS-C-1206-47u/16V-X5R
designator C?, comment 47u/16V-X5R
CHIP CAP.CER. 47uF 16V 20% X5R 1206; Database: 38401; Pkg Type: SMD; Modello: CERAMICO; Famiglia: CONDENSATORE; Distributor: FAE; Price Distributor Cad: 0,18; Caratteristiche: X5R
footprint CS-C-1206
pins: 1, 2

## CS-C-1206-220u/6.3V-X5R
designator C?, comment 220u/6.3V-X5R
CHIP CAP.CER. 220uF 6.3V 20% X5R 1206; Database: 41559; Temp Range: -55°..+85°; Pkg Type: SMD; Modello: CERAMICO; Famiglia: CONDENSATORE; Distributor: FAE; Price Distributor Cad: 0,3788; Caratteristiche: X5R
footprint CS-C-1206
pins: 1, 2

## CS-T-A-100u/6.3V
designator C122, comment NU
CHIP CAP.TANT. 100uF 6.3V 10% CASE A F930J107KAA AVX; Temp Range: -55°..+125°; Pkg Type: SMD; Modello: TANTALIO; Famiglia: CONDENSATORE; Price Distributor Cad: 0,59; Distributor: D-478-8152-1-ND
footprint CS-T-A
pins: 1, 2
text: T

## CS-T-B-220u/6.3V
designator C?, comment 220u/6.3V
CHIP CAP.TANT. 220uF 6.3V 10% CASE B F930J227KBA AVX; Famiglia: CONDENSATORE; Modello: TANTALIO; Pkg Type: SMD; Temp Range: -55°..+125°; Distributor: M-647-F930J227KBA; Price Distributor Cad: 0,549
footprint CS-T-B
pins: 1, 2
text: T

## DIODO4x - BAV99BRVA-7 -0.2A/75V
designator DS?, comment BAV99BRVA-7
DIODO ARRAY 0.2A 75V BAV99BRVA-7 SOT563 DIODES SMT; Modello: GENERICO; Note: 2x Serie; Caratteristiche: 4x; Pkg Type: SMD; Temp Range: -65°..+150°; Database: 40591; Famiglia: DIODO; Distributor: FAE; Price Distributor Cad: 0,044
footprint SOT563
pins: 1 A1, 2 C1, 3 AC2, 4 A2, 5 C2, 6 AC1

## DISTANZIALE - M2.5x0250
designator OBJ?, comment 9774025151R
DISTANZ. CIL. METALLO 5.1X2.5 9774025151R W.E SMT; Caratteristiche: M2.5; Database: 44635; Famiglia: MECCANICA; Modello: DISTANZIALE; Pkg Type: SMD; Distributor: FAE; Price Distributor Cad: 0,7343
footprint DIST-WASMSIM0250
pins: 1 (power)

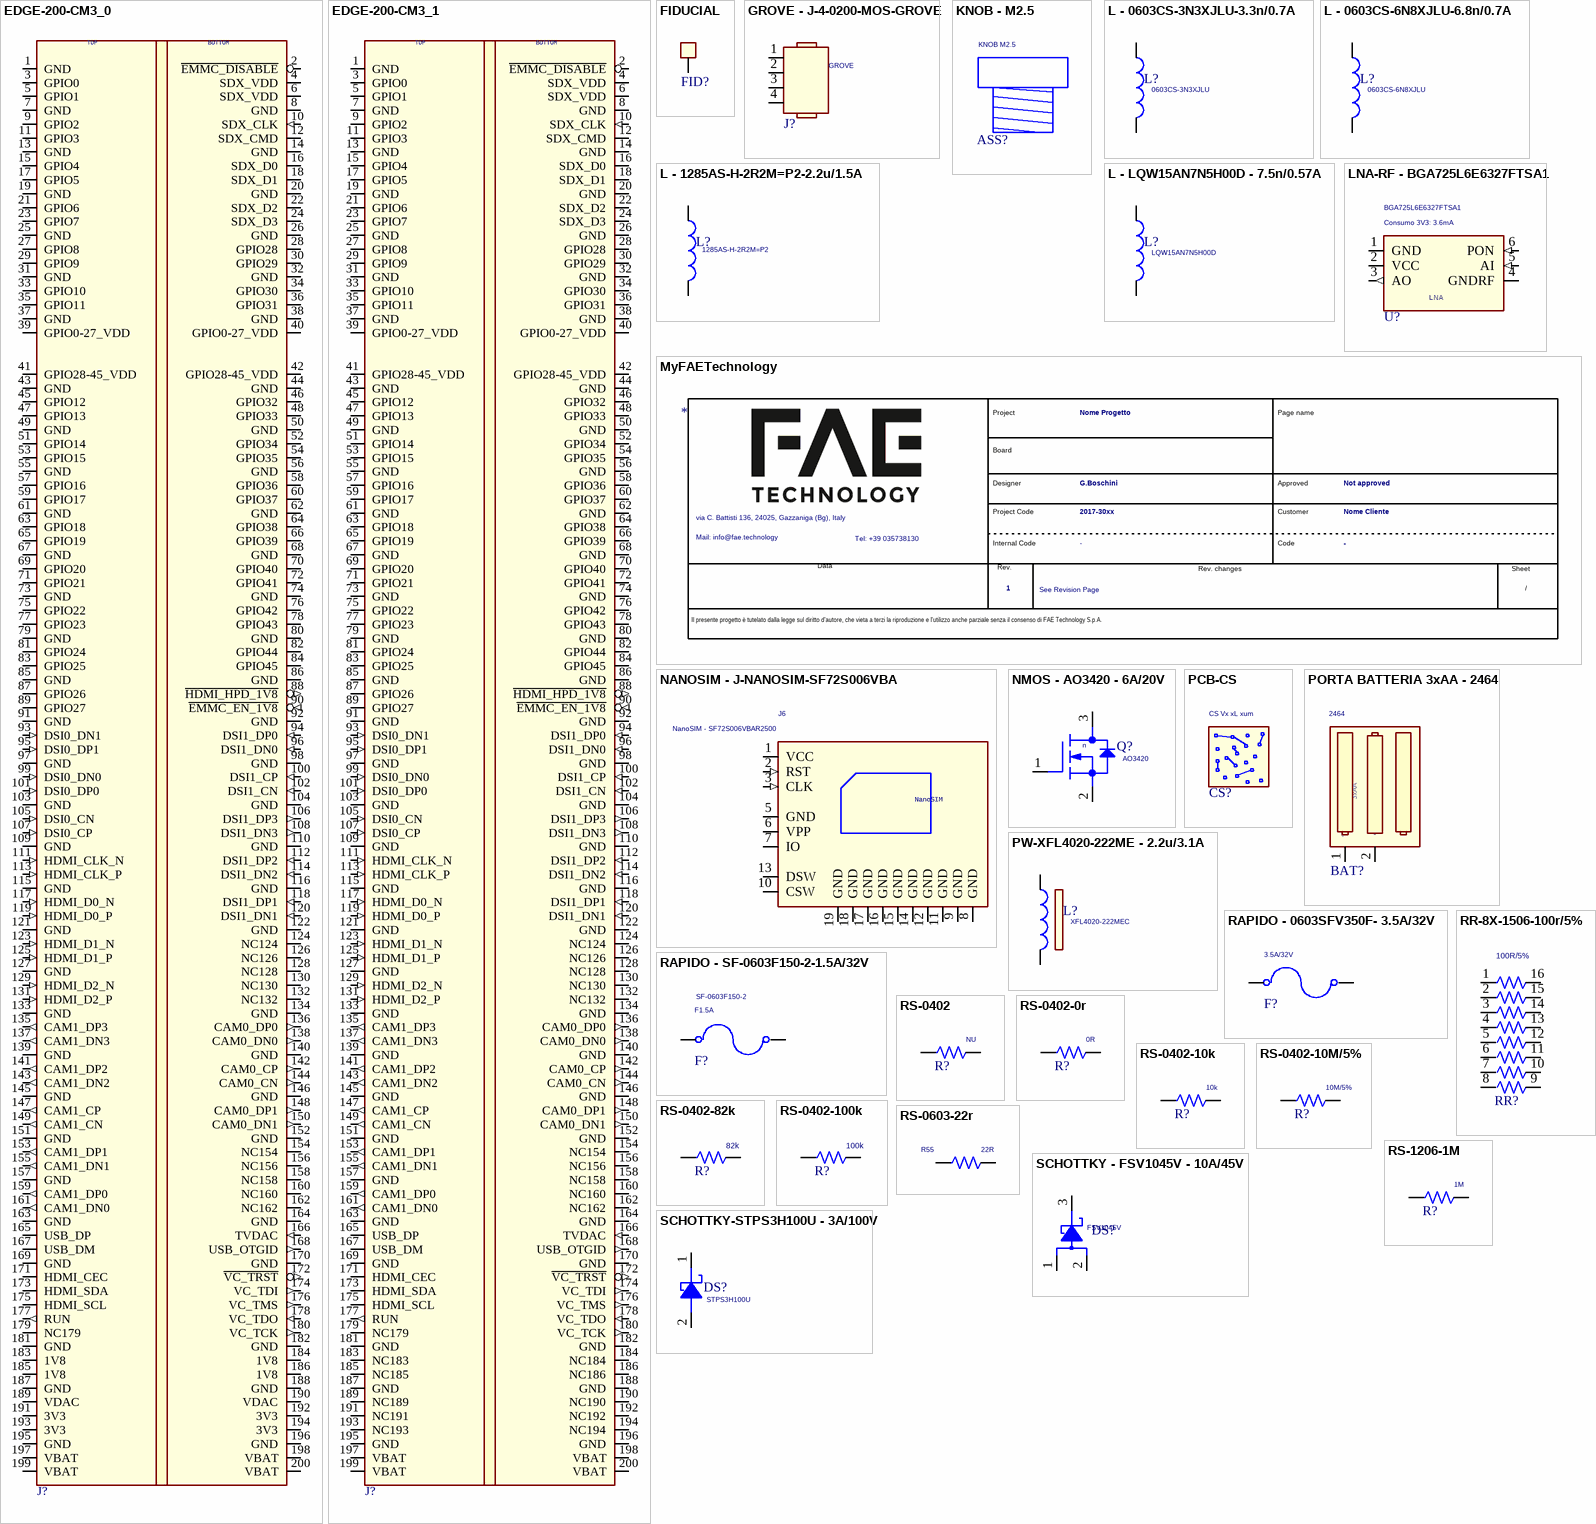
[diagram p3: symbols EDGE-200-CM3_0 to SCHOTTKY-STPS3H100U - 3A/100V]

## EDGE-200-CM3_0
designator J?, comment TPS  (value not drawn)
Modello: EDGE-DDR2; Caratteristiche: 200P; Famiglia: CONNETTORE
footprint DDR2-EDGE-200
pins: 1 GND (power), 2 ~{EMMC_DISABLE}, 3 GPIO0 (io), 4 SDX_VDD (power), 5 GPIO1 (io), 6 SDX_VDD (power), 7 GND (power), 8 GND (power), 9 GPIO2 (io), 10 SDX_CLK (in), 11 GPIO3 (io), 12 SDX_CMD (io), 13 GND (power), 14 GND (power), 15 GPIO4 (io), 16 SDX_D0 (io), 17 GPIO5 (io), 18 SDX_D1 (io), 19 GND (power), 20 GND (power), 21 GPIO6 (io), 22 SDX_D2 (io), 23 GPIO7 (io), 24 SDX_D3 (io), 25 GND (power), 26 GND (power), 27 GPIO8 (io), 28 GPIO28 (io), 29 GPIO9 (io), 30 GPIO29 (io), 31 GND (power), 32 GND (power), 33 GPIO10 (io), 34 GPIO30 (io), 35 GPIO11 (io), 36 GPIO31 (io), 37 GND (power), 38 GND (power), 39 GPIO0-27_VDD (power), 40 GPIO0-27_VDD (power), 41 GPIO28-45_VDD (power), 42 GPIO28-45_VDD (power), 43 GND (power), 44 GND (power), 45 GPIO12 (io), 46 GPIO32 (io), 47 GPIO13 (io), 48 GPIO33 (io), 49 GND (power), 50 GND (power), 51 GPIO14 (io), 52 GPIO34 (io), 53 GPIO15 (io), 54 GPIO35 (io), 55 GND (power), 56 GND (power), 57 GPIO16 (io), 58 GPIO36 (io), 59 GPIO17 (io), 60 GPIO37 (io), 61 GND (power), 62 GND (power), 63 GPIO18 (io), 64 GPIO38 (io), 65 GPIO19 (io), 66 GPIO39 (io), 67 GND (power), 68 GND (power), 69 GPIO20 (io), 70 GPIO40 (io), 71 GPIO21 (io), 72 GPIO41 (io), 73 GND (power), 74 GND (power), 75 GPIO22 (io), 76 GPIO42 (io), 77 GPIO23 (io), 78 GPIO43 (io), 79 GND (power), 80 GND (power), 81 GPIO24 (io), 82 GPIO44 (io), 83 GPIO25 (io), 84 GPIO45 (io), 85 GND (power), 86 GND (power), 87 GPIO26 (io), 88 ~{HDMI_HPD_1V8} (out), 89 GPIO27 (io), 90 ~{EMMC_EN_1V8} (in), 91 GND (power), 92 GND (power), 93 DSI0_DN1 (in), 94 DSI1_DP0 (in), 95 DSI0_DP1 (in), 96 DSI1_DN0 (in), 97 GND (power), 98 GND (power), 99 DSI0_DN0 (in), 100 DSI1_CP (in), 101 DSI0_DP0 (in), 102 DSI1_CN (in), 103 GND (power), 104 GND (power), 105 DSI0_CN (in), 106 DSI1_DP3 (out), 107 DSI0_CP (in), 108 DSI1_DN3 (out), 109 GND (power), 110 GND (power), 111 HDMI_CLK_N (in), 112 DSI1_DP2 (in), 113 HDMI_CLK_P (in), 114 DSI1_DN2 (in), 115 GND (power), 116 GND (power), 117 HDMI_D0_N (in), 118 DSI1_DP1 (in), 119 HDMI_D0_P (in), 120 DSI1_DN1 (in), 121 GND (power), 122 GND (power), 123 HDMI_D1_N (in), 124 NC124, 125 HDMI_D1_P (in), 126 NC126, 127 GND (power), 128 NC128, 129 HDMI_D2_N (in), 130 NC130, 131 HDMI_D2_P (in), 132 NC132, 133 GND (power), 134 GND (power), 135 CAM1_DP3 (out), 136 CAM0_DP0 (out), 137 CAM1_DN3 (out), 138 CAM0_DN0 (out), 139 GND (power), 140 GND (power), 141 CAM1_DP2 (out), 142 CAM0_CP (out), 143 CAM1_DN2 (out), 144 CAM0_CN (out), 145 GND (power), 146 GND (power), 147 CAM1_CP (out), 148 CAM0_DP1 (out), 149 CAM1_CN (out), 150 CAM0_DN1 (out), 151 GND (power), 152 GND (power), 153 CAM1_DP1 (out), 154 NC154, 155 CAM1_DN1 (out), 156 NC156, 157 GND (power), 158 NC158, 159 CAM1_DP0 (out), 160 NC160, 161 CAM1_DN0 (out), 162 NC162, 163 GND (power), 164 GND (power), 165 USB_DP (io), 166 TVDAC (in), 167 USB_DM (io), 168 USB_OTGID (out), 169 GND (power), 170 GND (power), 171 HDMI_CEC (io), 172 ~{VC_TRST} (out), 173 HDMI_SDA (io), 174 VC_TDI (out), 175 HDMI_SCL (io), 176 VC_TMS (out), 177 RUN (out), 178 VC_TDO (in), 179 NC179, 180 VC_TCK (out), 181 GND (power), 182 GND (power), 183 1V8, 184 1V8, 185 1V8, 186 1V8, 187 GND (power), 188 GND (power), 189 VDAC, 190 VDAC, 191 3V3, 192 3V3, 193 3V3, 194 3V3, 195 GND (power), 196 GND (power), 197 VBAT (power), 198 VBAT (power), 199 VBAT (power), 200 VBAT (power)